# Altium integrated library LoRa.IntLib: 17 symbols
Pins are listed as number, name and electrical type; pins without a type are passive.

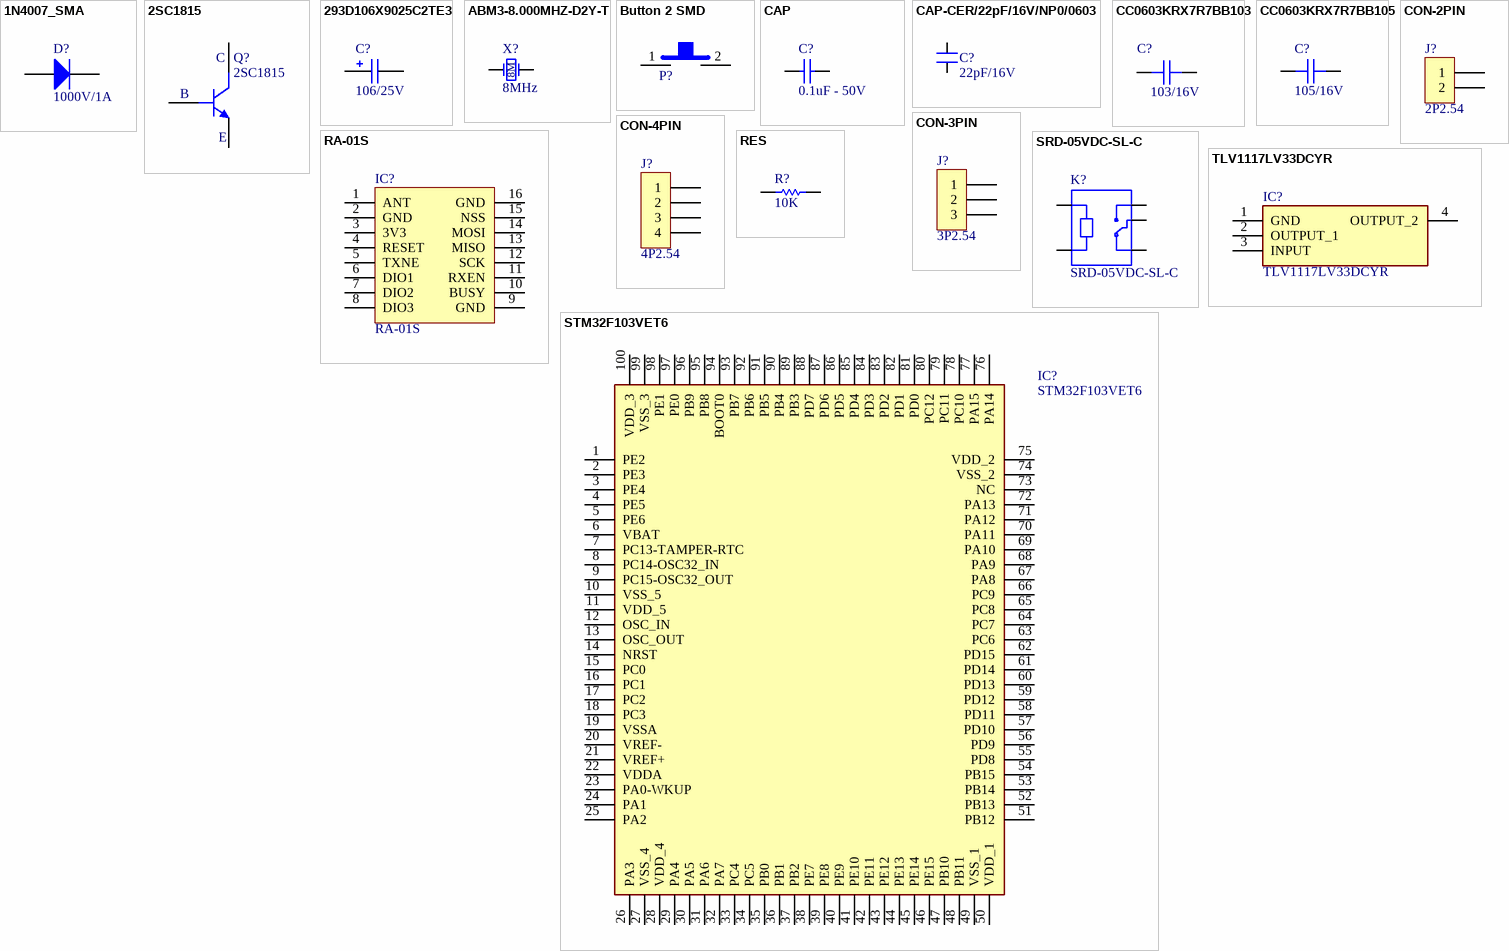
[diagram p0: symbols 1N4007_SMA to TLV1117LV33DCYR]

## 1N4007_SMA
designator D?, comment 1000V/1A
DIODE GEN PURP 1KV 1A SMA; MPN: MRA4007T3G; Solder: SMT; Value: 1000V/1A; MFR: *
footprint DIODE_DO214AC_SMA (Diode 2214AC)
pins: 1 A, 2 K

## 2SC1815
designator Q?
TRANS NPN 50V 0.15A SOT23-3; Solder: SMT; MPN: 2SC1815; Value: 2SC1815
footprint SOT23_3 (SOT23, 3-Leads, Body 2,90x2,30mm, Pitch 0,95mm, IPC Medium Density)
pins: 1 B, 2 E, 3 C

## 293D106X9025C2TE3
designator C?, comment 106/25V
CAP TANT 10uF 25V 10% 2312; MPN: 293D106X9025C2TE3;T491C106K025AT7280; CompanyID: VT-00020; Solder: SMT; Value: 106/25V; Category: CAPACITOR; PinCount: 2
footprint CAP_TANTAL_2312(6032) (Chip Resistor, Body 6.0x3.2mm, IPC High Density)
pins: 1, 2

## ABM3-8.000MHZ-D2Y-T
designator X?, comment 8MHz
CRYSTAL 8.0000MHZ 18pF SMD; MPN: ABM3-8.000MHZ-D2Y-T; Solder: SMT; CompanyID: VT-00517; Value: 8MHz; Category: CRYSTAL
footprint CRYSTAL_ABM3 5x3.2mm (Crystal 5x3.2mm)
pins: 1 OSC1, 2 OSC2
text: 8M

## Button 2 SMD
designator P?
SMD Mini Push Button Switch 2 Pin 3x6x2.7mm; MPN: SMD Mini Push Button 2 SMD; Link: https://ram-e-shop.com/product/press2pin-smd/
footprint SW 2P SMD
pins: 1, 2

## CAP
designator C?, comment 0.1uF - 50V
CAP CER 0.1UF 50V X7R 0603; Partnumber: CL10B104KB8NNNC; Manufacture: Samsung Electro-Mechanics; Detailed Value: 0.1uF - 50V - 0603; PROJECT: KHO; Value: 0.1uF - 50V; Creator: ThangND; Category: Capacitor; Mounting type: SMD
footprint CAPC_0603_N
pins: 1, 2

## CAP-CER/22pF/16V/NP0/0603
designator C?, comment 22pF/16V
CAP CER 22PF 16V NP0 0603; Manufacturer: Kemet; Manufacturer Part Number: C0603C220K4GACTU; Tolerance: ±10%; Temperature Coefficient: C0G, NP0; Supplier 1: Digi-Key; Supplier Part Number 1: 399-9031-1-ND; Stock: 40435; Pricing: 1=0.1, 10=0.055, 25=0.0392, 50=0.0298, 100=0.0252, 250=0.02064, 1000=0.0135 (USD); Packaging: Cut Tape (CT); Capacitance: 22pF; Voltage - Rated: 16V; Mounting Type: Surface Mount, MLCC; Operating Temperature: -55°C ~ 125°C; Applications: General Purpose; Ratings: -; Package / Case: 0603 (1608 Metric); Size / Dimension: 0.063" L x 0.031" W (1.60mm x 0.80mm); Height - Seated (Max): -; Thickness (Max): 0.034" (0.87mm); Lead Spacing: -; Features: -; Lead Style: -; ComponentLink1URL: http://www.kemet.com/docfinder?Partnumber=C0603C220K4GACTU; ComponentLink1Description: http://www.kemet.com/docfinder?Partnumber=C0603C220K4GACTU
footprint C0603-1608 (Chip Capacitor, Body 1.6x0.8mm, 1608)
pins: 1, 2

## CC0603KRX7R7BB103
designator C?, comment 103/16V
CAP CER 10nF 16V 10% X7R 0603; MPN: CC0603KRX7R7BB103; CompanyID: VT-00592; Solder: SMT; Value: 103/16V; Category: CAPACITOR; PinCount: 2
footprint CAPC-0603 (1608) (Resistor, Chip; 1.60 mm L X 0.80 mm W X 0.50 mm H body)
pins: 1, 2

## CC0603KRX7R7BB105
designator C?, comment 105/16V
CAP CER 1uF 10% 16V X7R 0603; MPN: CC0603KRX7R7BB105; CompanyID: VT-00017; Solder: SMT; Value: 105/16V; Category: CAPACITOR; PinCount: 2
footprint CAPC-0603 (1608) (Resistor, Chip; 1.60 mm L X 0.80 mm W X 0.50 mm H body)
pins: 1, 2

## CON-2PIN
designator J?, comment 2P2.54
JUMP-2.54-2PIN-M-TH; PROJECT: SmartHome; Partnumber: JUMP-2.54-2PIN-M-TH; Value: 2P2.54; Creator: Tunn; Category: Connector; Mounting type: TH; Detailed Value: JUMP-2.54-2PIN-M-TH
footprint JUMP-2.54-2PIN-M-TH
pins: 1, 2

## CON-3PIN
designator J?, comment 3P2.54
Partnumber: JUMP-2.54-3PIN-M-TH; Value: 3P2.54; Creator: Tunn; Category: Connector; Mounting type: TH; Detailed Value: 3P2.54
footprint JUMP-2.54-3PIN-M-TH
pins: 1, 2, 3

## CON-4PIN
designator J?, comment 4P2.54
JUMP-2.54-4PIN-M-TH; Partnumber: JUMP-2.54-4PIN-M-TH; Value: 4P2.54; Creator: Tunn; Category: Connector; Mounting type: TH; Detailed Value: 4P2.54
footprint JUMP-2.54-4PIN-M-TH
pins: 1, 2, 3, 4

## RA-01S
designator IC?
pins: 1 ANT, 2 GND, 3 3V3, 4 RESET, 5 TXNE, 6 DIO1, 7 DIO2, 8 DIO3, 9 GND, 10 BUSY, 11 RXEN, 12 SCK, 13 MISO, 14 MOSI, 15 NSS, 16 GND

## RES
designator R?, comment 10K
RES SMD 10K OHM 1% 1/10W 0603; Partnumber: RI0603L1002FT; Manufacture: Hottech; Detailed Value: 10K - 1% - 1/10W; PROJECT: KHO; Value: 10K; Creator: anhdn; Category: Resistor; Mounting type: SMD
footprint RESC_0603_N
pins: 1, 2

## SRD-05VDC-SL-C
designator K?
5V Trigger Relay Module For Arduino And Raspberry Pi 5V Trigger Relay Module For Arduino And Raspberry Pi; MF: Songle Relay; Package: None; Availability: Unavailable; Value: *; MP: SRD-05VDC-SL-C; SnapEDA_Link: https://www.snapeda.com/parts/SRD-05VDC-SL-C/Songle%20Relay/view-part/1029484/?ref=snap; Price: None
footprint RELAY_SRD-05VDC-SL-C
pins: A1, A2, COM, NC, NO

## STM32F103VET6
designator IC?
Integrated Circuit; Manufacturer_Name: STMicroelectronics; Datasheet Link: http://www.st.com/st-web-ui/static/active/en/resource/technical/document/datasheet/CD00191185.pdf; Height: 1.6mm; Manufacturer_Part_Number: STM32F103VET6
footprint QFP50P1600X1600X160-100N
pins: 1 PE2, 2 PE3, 3 PE4, 4 PE5, 5 PE6, 6 VBAT, 7 PC13-TAMPER-RTC, 8 PC14-OSC32_IN, 9 PC15-OSC32_OUT, 10 VSS_5, 11 VDD_5, 12 OSC_IN, 13 OSC_OUT, 14 NRST, 15 PC0, 16 PC1, 17 PC2, 18 PC3, 19 VSSA, 20 VREF-, 21 VREF+, 22 VDDA, 23 PA0-WKUP, 24 PA1, 25 PA2, 26 PA3, 27 VSS_4, 28 VDD_4, 29 PA4, 30 PA5, 31 PA6, 32 PA7, 33 PC4, 34 PC5, 35 PB0, 36 PB1, 37 PB2, 38 PE7, 39 PE8, 40 PE9, 41 PE10, 42 PE11, 43 PE12, 44 PE13, 45 PE14, 46 PE15, 47 PB10, 48 PB11, 49 VSS_1, 50 VDD_1, 51 PB12, 52 PB13, 53 PB14, 54 PB15, 55 PD8, 56 PD9, 57 PD10, 58 PD11, 59 PD12, 60 PD13, 61 PD14, 62 PD15, 63 PC6, 64 PC7, 65 PC8, 66 PC9, 67 PA8, 68 PA9, 69 PA10, 70 PA11, 71 PA12, 72 PA13, 73 NC, 74 VSS_2, 75 VDD_2, 76 PA14, 77 PA15, 78 PC10, 79 PC11, 80 PC12, 81 PD0, 82 PD1, 83 PD2, 84 PD3, 85 PD4, 86 PD5, 87 PD6, 88 PD7, 89 PB3, 90 PB4, 91 PB5, 92 PB6, 93 PB7, 94 BOOT0, 95 PB8, 96 PB9, 97 PE0, 98 PE1, 99 VSS_3, 100 VDD_3

## TLV1117LV33DCYR
designator IC?
Integrated Circuit; Manufacturer_Name: Texas Instruments; Datasheet Link: http://www.ti.com/lit/gpn/tlv1117lv; Height: 1.8mm; Mouser2 Part Number: 595-TLV1117LV33DCYR; Mouser2 Price/Stock: https://www.mouser.com/Search/Refine.aspx?Keyword=595-TLV1117LV33DCYR; Manufacturer_Part_Number: TLV1117LV33DCYR
footprint SOT230P700X180-4N
pins: 1 GND, 2 OUTPUT_1, 3 INPUT, 4 OUTPUT_2